# Altium footprint library Generic Footprint.PcbLib: 160 footprints (part 18 of 20)
Each footprint in its own frame and in the unit in brackets; x right, y up, seen from the top. Pads: shape width x height; smd on the part's side, far side on the other; paste and mask are expansions set on the pad; w line width, h text height; cw(c..) or ccw(c..) is an arc to the next point about the centre after c.
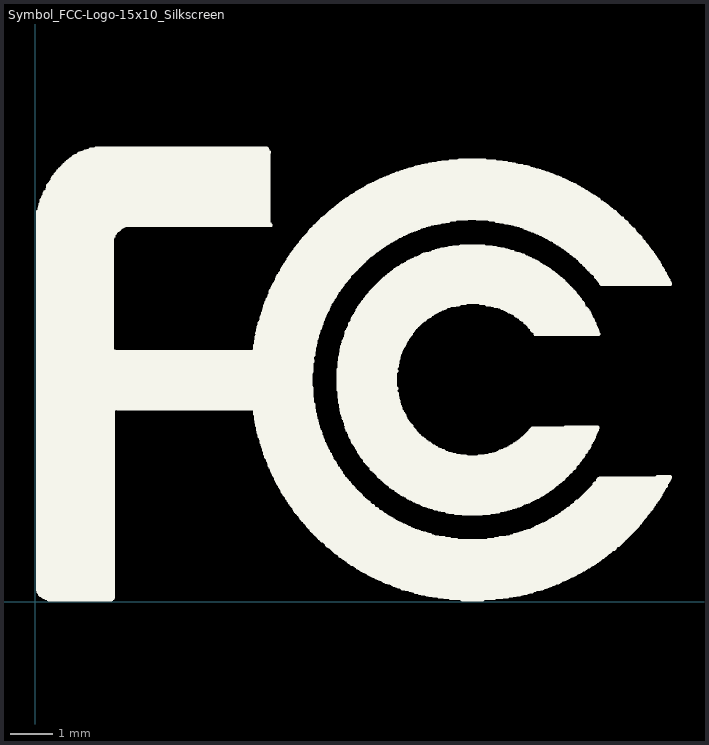
[diagram p17: the footprint, top view; thin cyan lines are the x and y axes]

## Symbol_FCC-Logo-15x10_Silkscreen [mil]
pads (8620):
  round 3.94 on Top Overlay: 1(2.65,11) 1(2.65,11.67) 1(2.65,12.34) 1(2.65,13.01) 1(2.65,13.68) 1(2.65,14.35) 1(2.65,15.02) 1(2.65,15.68) 1(2.65,16.35) 1(2.65,17.02) 1(2.65,17.69) 1(2.65,18.36) 1(2.65,19.03) 1(2.65,19.7) 1(2.65,20.37) 1(2.65,21.04) 1(2.65,21.71) 1(2.65,22.38) 1(2.65,23.05) 1(2.65,23.72) 1(2.65,24.39) 1(2.65,25.05) 1(2.65,25.72) 1(2.65,26.39) 1(2.65,27.06) 1(2.65,27.73) 1(2.65,28.4) 1(2.65,29.07) 1(2.65,29.74) 1(2.65,30.41) 1(2.65,31.08) 1(2.65,31.75) 1(2.65,32.42) 1(2.65,33.09) 1(2.65,33.76) 1(2.65,34.42) 1(2.65,35.09) 1(2.65,35.76) 1(2.65,36.43) 1(2.65,37.1) 1(2.65,37.77) 1(2.65,38.44) 1(2.65,39.11) 1(2.65,39.78) 1(2.65,40.45) 1(2.65,41.12) 1(2.65,41.79) 1(2.65,42.46) 1(2.65,43.13) 1(2.65,43.79) 1(2.65,44.46) 1(2.65,45.13) 1(2.65,45.8) 1(2.65,46.47) 1(2.65,47.14) 1(2.65,47.81) 1(2.65,48.48) 1(2.65,49.15) 1(2.65,49.82) 1(2.65,50.49) 1(2.65,51.16) 1(2.65,51.83) 1(2.65,52.5) 1(2.65,53.16) 1(2.65,53.83) 1(2.65,54.5) 1(2.65,55.17) 1(2.65,55.84) 1(2.65,56.51) 1(2.65,57.18) 1(2.65,57.85) 1(2.65,58.52) 1(2.65,59.19) 1(2.65,59.86) 1(2.65,60.53) 1(2.65,61.2) 1(2.65,61.87) 1(2.65,62.54) 1(2.65,63.2) 1(2.65,63.87) 1(2.65,64.54) 1(2.65,65.21) 1(2.65,65.88) 1(2.65,66.55) 1(2.65,67.22) 1(2.65,67.89) 1(2.65,68.56) 1(2.65,69.23) 1(2.65,69.9) 1(2.65,70.57) 1(2.65,71.24) 1(2.65,71.91) 1(2.65,72.57) 1(2.65,73.24) 1(2.65,73.91) 1(2.65,74.58) 1(2.65,75.25) 1(2.65,75.92) 1(2.65,76.59) 1(2.65,77.26) 1(2.65,77.93) 1(2.65,78.6) 1(2.65,79.27) 1(2.65,79.94) 1(2.65,80.61) 1(2.65,81.28) 1(2.65,81.94) 1(2.65,82.61) 1(2.65,83.28) 1(2.65,83.95) 1(2.65,84.62) 1(2.65,85.29) 1(2.65,85.96) 1(2.65,86.63) 1(2.65,87.3) 1(2.65,87.97) 1(2.65,88.64) 1(2.65,89.31) 1(2.65,89.98) 1(2.65,90.65) 1(2.65,91.31) 1(2.65,91.98) 1(2.65,92.65) 1(2.65,93.32) 1(2.65,93.99) 1(2.65,94.66) 1(2.65,95.33) 1(2.65,96) 1(2.65,96.67) 1(2.65,97.34) 1(2.65,98.01) 1(2.65,98.68) 1(2.65,99.35) 1(2.65,100.02) 1(2.65,100.68) 1(2.65,101.35) 1(2.65,102.02) 1(2.65,102.69) 1(2.65,103.36) 1(2.65,104.03) 1(2.65,104.7) 1(2.65,105.37) 1(2.65,106.04) 1(2.65,106.71) 1(2.65,107.38) 1(2.65,108.05) 1(2.65,108.72) 1(2.65,109.39) 1(2.65,110.05) 1(2.65,110.72) 1(2.65,111.39) 1(2.65,112.06) 1(2.65,112.73) 1(2.65,113.4) 1(2.65,114.07) 1(2.65,114.74) 1(2.65,115.41) 1(2.65,116.08) 1(2.65,116.75) 1(2.65,117.42) 1(2.65,118.09) 1(2.65,118.76) 1(2.65,119.42) 1(2.65,120.09) 1(2.65,120.76) 1(2.65,121.43) 1(2.65,122.1) 1(2.65,122.77) 1(2.65,123.44) 1(2.65,124.11) 1(2.65,124.78) 1(2.65,125.45) 1(2.65,126.12) 1(2.65,126.79) 1(2.65,127.46) 1(2.65,128.13) 1(2.65,128.79) 1(2.65,129.46) 1(2.65,130.13) 1(2.65,130.8) 1(2.65,131.47) 1(2.65,132.14) 1(2.65,132.81) 1(2.65,133.48) 1(2.65,134.15) 1(2.65,134.82) 1(2.65,135.49) 1(2.65,136.16) 1(2.65,136.83) 1(2.65,137.5) 1(2.65,138.17) 1(2.65,138.83) 1(2.65,139.5) 1(2.65,140.17) 1(2.65,140.84) 1(2.65,141.51) 1(2.65,142.18) 1(2.65,142.85) 1(2.65,143.52) 1(2.65,144.19) 1(2.65,144.86) 1(2.65,145.53) 1(2.65,146.2) 1(2.65,146.87) 1(2.65,147.54) 1(2.65,148.2) 1(2.65,148.87) 1(2.65,149.54) 1(2.65,150.21) 1(2.65,150.88) 1(2.65,151.55) 1(2.65,152.22) 1(2.65,152.89) 1(2.65,153.56) 1(2.65,154.23) 1(2.65,154.9) 1(2.65,155.57) 1(2.65,156.24) 1(2.65,156.91) 1(2.65,157.57) 1(2.65,158.24) 1(2.65,158.91) 1(2.65,159.58) 1(2.65,160.25) 1(2.65,160.92) 1(2.65,161.59) 1(2.65,162.26) 1(2.65,162.93) 1(2.65,163.6) 1(2.65,164.27) 1(2.65,164.94) 1(2.65,165.61) 1(2.65,166.28) 1(2.65,166.94) 1(2.65,167.61) 1(2.65,168.28) 1(2.65,168.95) 1(2.65,169.62) 1(2.65,170.29) 1(2.65,170.96) 1(2.65,171.63) 1(2.65,172.3) 1(2.65,172.97) 1(2.65,173.64) 1(2.65,174.31) 1(2.65,174.98) 1(2.65,175.65) 1(2.65,176.31) 1(2.65,176.98) 1(2.65,177.65) 1(2.65,178.32) 1(2.65,178.99) 1(2.65,179.66) 1(2.65,180.33) 1(2.65,181) 1(2.65,181.67) 1(2.65,182.34) 1(2.65,183.01) 1(2.65,183.68) 1(2.65,184.35) 1(2.65,185.02) 1(2.65,185.68) 1(2.65,186.35) 1(2.65,187.02) 1(2.65,187.69) 1(2.65,188.36) 1(2.65,189.03) 1(2.65,189.7) 1(2.65,190.37) 1(2.65,191.04) 1(2.65,191.71) 1(2.65,192.38) 1(2.65,193.05) 1(2.65,193.72) 1(2.65,194.39) 1(2.65,195.05) 1(2.65,195.72) 1(2.65,196.39) 1(2.65,197.06) 1(2.65,197.73) 1(2.65,198.4) 1(2.65,199.07) 1(2.65,199.74) 1(2.65,200.41) 1(2.65,201.08) 1(2.65,201.75) 1(2.65,202.42) 1(2.65,203.09) 1(2.65,203.76) 1(2.65,204.42) 1(2.65,205.09) 1(2.65,205.76) 1(2.65,206.43) 1(2.65,207.1) 1(2.65,207.77) 1(2.65,208.44) 1(2.65,209.11) 1(2.65,209.78) 1(2.65,210.45) 1(2.65,211.12) 1(2.65,211.79) 1(2.65,212.46) 1(2.65,213.13) 1(2.65,213.79) 1(2.65,214.46) 1(2.65,215.13) 1(2.65,215.8) 1(2.65,216.47) 1(2.65,217.14) 1(2.65,217.81) 1(2.65,218.48) 1(2.65,219.15) 1(2.65,219.82) 1(2.65,220.49) 1(2.65,221.16) 1(2.65,221.83) 1(2.65,222.5) 1(2.65,223.17) 1(2.65,223.83) 1(2.65,224.5) 1(2.65,225.17) 1(2.65,225.84) 1(2.65,226.51) 1(2.65,227.18) 1(2.65,227.85) 1(2.65,228.52) 1(2.65,229.19) 1(2.65,229.86) 1(2.65,230.53) 1(2.65,231.2) 1(2.65,231.87) 1(2.65,232.54) 1(2.65,233.2) 1(2.65,233.87) 1(2.65,234.54) 1(2.65,235.21) 1(2.65,235.88) 1(2.65,236.55) 1(2.65,237.22) 1(2.65,237.89) 1(2.65,238.56) 1(2.65,239.23) 1(2.65,239.9) 1(2.65,240.57) 1(2.65,241.24) 1(2.65,241.91) 1(2.65,242.57) 1(2.65,243.24) 1(2.65,243.91) 1(2.65,244.58) 1(2.65,245.25) 1(2.65,245.92) 1(2.65,246.59) 1(2.65,247.26) 1(2.65,247.93) 1(2.65,248.6) 1(2.65,249.27) 1(2.65,249.94) 1(2.65,250.61) 1(2.65,251.28) 1(2.65,251.94) 1(2.65,252.61) 1(2.65,253.28) 1(2.65,253.95) 1(2.65,254.62) 1(2.65,255.29) 1(2.65,255.96) 1(2.65,256.63) 1(2.65,257.3) 1(2.65,257.97) 1(2.65,258.64) 1(2.65,259.31) 1(2.65,259.98) 1(2.65,260.65) 1(2.65,261.31) 1(2.65,261.98) 1(2.65,262.65) 1(2.65,263.32) 1(2.65,263.99) 1(2.65,264.66) 1(2.65,265.33) 1(2.65,266) 1(2.65,266.67) 1(2.65,267.34) 1(2.65,268.01) 1(2.65,268.68) 1(2.65,269.35) 1(2.65,270.02) 1(2.65,270.68) 1(2.65,271.35) 1(2.65,272.02) 1(2.65,272.69) 1(2.65,273.36) 1(2.65,274.03) 1(2.65,274.7) 1(2.65,275.37) 1(2.65,276.04) 1(2.65,276.71) 1(2.65,277.38) 1(2.65,278.05) 1(2.65,278.72) 1(2.65,279.39) 1(2.65,280.05) 1(2.65,280.72) 1(2.65,281.39) 1(2.65,282.06) 1(2.65,282.73) 1(2.65,283.4) 1(2.65,284.07) 1(2.65,284.74) 1(2.65,285.41) 1(2.65,286.08) 1(2.65,286.75) 1(2.65,287.42) 1(2.65,288.09) 1(2.65,288.76) 1(2.65,289.42) 1(2.65,290.09) 1(2.65,290.76) 1(2.65,291.43) 1(2.65,292.1) 1(2.65,292.77) 1(2.65,293.44) 1(2.65,294.11) 1(2.65,294.78) 1(2.65,295.45) 1(2.65,296.12) 1(2.65,296.79) 1(2.65,297.46) 1(2.65,298.13) 1(2.65,298.8) 1(2.65,299.46) 1(2.65,300.13) 1(2.65,300.8) 1(2.65,301.47) 1(2.65,302.14) 1(2.65,302.81) 1(2.65,303.48) 1(2.65,304.15) 1(2.65,304.82) 1(2.65,305.49) 1(2.65,306.16) 1(2.65,306.83) 1(2.65,307.5) 1(2.65,308.17) 1(2.65,308.83) 1(2.65,309.5) 1(2.65,310.17) 1(2.65,310.84) 1(2.65,311.51) 1(2.65,312.18) 1(2.65,312.85) 1(2.65,313.52) 1(2.65,314.19) 1(2.65,314.86) 1(2.65,315.53) 1(2.65,316.2) 1(2.65,316.87) 1(2.65,317.54) 1(2.65,318.2) 1(2.65,318.87) 1(2.65,319.54) 1(2.65,320.21) 1(2.65,320.88) 1(2.65,321.55) 1(2.65,322.22) 1(2.65,322.89) 1(2.65,323.56) 1(2.65,324.23) 1(2.65,324.9) 1(2.65,325.57) 1(2.65,326.24) 1(2.65,326.91) 1(2.65,327.57) 1(2.65,328.24) 1(2.65,328.91) 1(2.65,329.58) 1(2.65,330.25) 1(2.65,330.92) 1(2.65,331.59) 1(2.65,332.26) 1(2.65,332.93) 1(2.65,333.6) 1(2.65,334.27) 1(2.65,334.94) 1(2.65,335.61) 1(2.65,336.28) 1(2.65,336.94) 1(2.65,337.61) 1(2.65,338.28) 1(2.65,338.95) 1(2.65,339.62) 1(2.65,340.29) 1(2.65,340.96) 1(2.65,341.63) 1(2.65,342.3) 1(2.65,342.97) 1(2.65,343.64) 1(2.65,344.31) 1(2.65,344.98) 1(2.65,345.65) 1(2.65,346.31) 1(2.65,346.98) 1(2.65,347.65) 1(2.65,348.32) 1(2.65,348.99) 1(2.65,349.66) 1(2.65,350.33) 1(2.65,351) 1(2.65,351.67) 1(2.65,352.34) 1(2.65,353.01) 1(2.65,353.68) 1(2.65,354.35) 1(2.65,355.02) 1(2.65,355.68) 1(2.65,356.35) 1(2.65,357.02) 1(2.65,357.69) 1(2.65,358.36) 1(2.65,359.03) 1(3.32,8.99) 1(3.99,9.66) 1(3.99,12.34) 1(3.99,13.01) 1(3.99,13.68) 1(3.99,14.35) 1(3.99,15.02) 1(3.99,15.68) 1(3.99,16.35) 1(3.99,17.02) 1(3.99,17.69) 1(3.99,18.36) 1(3.99,19.03) 1(3.99,19.7) 1(3.99,20.37) 1(3.99,21.04) 1(3.99,21.71) 1(3.99,22.38) 1(3.99,23.05) 1(3.99,23.72) 1(3.99,24.39) 1(3.99,25.05) 1(3.99,25.72) 1(3.99,26.39) 1(3.99,27.06) 1(3.99,27.73) 1(3.99,28.4) 1(3.99,29.07) 1(3.99,29.74) 1(3.99,30.41) 1(3.99,31.08) 1(3.99,31.75) 1(3.99,32.42) 1(3.99,33.09) 1(3.99,33.76) 1(3.99,34.42) 1(3.99,35.09) 1(3.99,35.76) 1(3.99,36.43) 1(3.99,37.1) 1(3.99,37.77) 1(3.99,38.44) 1(3.99,39.11) 1(3.99,39.78) 1(3.99,40.45) 1(3.99,41.12) 1(3.99,41.79) 1(3.99,42.46) 1(3.99,43.13) 1(3.99,43.79) 1(3.99,44.46) 1(3.99,45.13) 1(3.99,45.8) 1(3.99,46.47) 1(3.99,47.14) 1(3.99,47.81) 1(3.99,48.48) 1(3.99,49.15) 1(3.99,49.82) 1(3.99,50.49) 1(3.99,51.16) 1(3.99,51.83) 1(3.99,52.5) 1(3.99,53.16) 1(3.99,53.83) 1(3.99,54.5) 1(3.99,55.17) 1(3.99,55.84) 1(3.99,56.51) 1(3.99,57.18) 1(3.99,57.85) 1(3.99,58.52) 1(3.99,59.19) 1(3.99,59.86) 1(3.99,60.53) 1(3.99,61.2) 1(3.99,61.87) 1(3.99,62.54) 1(3.99,63.2) 1(3.99,63.87) 1(3.99,64.54) 1(3.99,65.21) 1(3.99,65.88) 1(3.99,66.55) 1(3.99,67.22) 1(3.99,67.89) 1(3.99,68.56) 1(3.99,69.23) 1(3.99,69.9) 1(3.99,70.57) 1(3.99,71.24) 1(3.99,71.91) 1(3.99,72.57) 1(3.99,73.24) 1(3.99,73.91) 1(3.99,74.58) 1(3.99,75.25) 1(3.99,75.92) 1(3.99,76.59) 1(3.99,77.26) 1(3.99,77.93) 1(3.99,78.6) 1(3.99,79.27) 1(3.99,79.94) 1(3.99,80.61) 1(3.99,81.28) 1(3.99,81.94) 1(3.99,82.61) 1(3.99,83.28) 1(3.99,83.95) 1(3.99,84.62) 1(3.99,85.29) 1(3.99,85.96) 1(3.99,86.63) 1(3.99,87.3) 1(3.99,87.97) 1(3.99,88.64) 1(3.99,89.31) 1(3.99,89.98) 1(3.99,90.65) 1(3.99,91.31) 1(3.99,91.98) 1(3.99,92.65) 1(3.99,93.32) 1(3.99,93.99) 1(3.99,94.66) 1(3.99,95.33) 1(3.99,96) 1(3.99,96.67) 1(3.99,97.34) 1(3.99,98.01) 1(3.99,98.68) 1(3.99,99.35) 1(3.99,100.02) 1(3.99,100.68) 1(3.99,101.35) 1(3.99,102.02) 1(3.99,102.69) 1(3.99,103.36) 1(3.99,104.03) 1(3.99,104.7) 1(3.99,105.37) 1(3.99,106.04) 1(3.99,106.71) 1(3.99,107.38) 1(3.99,108.05) 1(3.99,108.72) 1(3.99,109.39) 1(3.99,110.05) 1(3.99,110.72) 1(3.99,111.39) 1(3.99,112.06) 1(3.99,112.73) 1(3.99,113.4) 1(3.99,114.07) 1(3.99,114.74) 1(3.99,115.41) 1(3.99,116.08) 1(3.99,116.75) 1(3.99,117.42) 1(3.99,118.09) 1(3.99,118.76) 1(3.99,119.42) 1(3.99,120.09) 1(3.99,120.76) 1(3.99,121.43) 1(3.99,122.1) 1(3.99,122.77) 1(3.99,123.44) 1(3.99,124.11) 1(3.99,124.78) 1(3.99,125.45) 1(3.99,126.12) 1(3.99,126.79) 1(3.99,127.46) 1(3.99,128.13) 1(3.99,128.79) 1(3.99,129.46) 1(3.99,130.13) 1(3.99,130.8) 1(3.99,131.47) 1(3.99,132.14) 1(3.99,132.81) 1(3.99,133.48) 1(3.99,134.15) 1(3.99,134.82) 1(3.99,135.49) 1(3.99,136.16) 1(3.99,136.83) 1(3.99,137.5) 1(3.99,138.17) 1(3.99,138.83) 1(3.99,139.5) 1(3.99,140.17) 1(3.99,140.84) 1(3.99,141.51) 1(3.99,142.18) 1(3.99,142.85) 1(3.99,143.52) 1(3.99,144.19) 1(3.99,144.86) 1(3.99,145.53) 1(3.99,146.2) 1(3.99,146.87) 1(3.99,147.54) 1(3.99,148.2) 1(3.99,148.87) 1(3.99,149.54) 1(3.99,150.21) 1(3.99,150.88) 1(3.99,151.55) 1(3.99,152.22) 1(3.99,152.89) 1(3.99,153.56) 1(3.99,154.23) 1(3.99,154.9) 1(3.99,155.57) 1(3.99,156.24) 1(3.99,156.91) 1(3.99,157.57) 1(3.99,158.24) 1(3.99,158.91) 1(3.99,159.58) 1(3.99,160.25) 1(3.99,160.92) 1(3.99,161.59) 1(3.99,162.26) 1(3.99,162.93) 1(3.99,163.6) 1(3.99,164.27) 1(3.99,164.94) 1(3.99,165.61) 1(3.99,166.28) 1(3.99,166.94) 1(3.99,167.61) 1(3.99,168.28) 1(3.99,168.95) 1(3.99,169.62) 1(3.99,170.29) 1(3.99,170.96) 1(3.99,171.63) 1(3.99,172.3) 1(3.99,172.97) 1(3.99,173.64) 1(3.99,174.31) 1(3.99,174.98) 1(3.99,175.65) 1(3.99,176.31) 1(3.99,176.98) 1(3.99,177.65) 1(3.99,178.32) 1(3.99,178.99) 1(3.99,179.66) 1(3.99,180.33) 1(3.99,181) 1(3.99,181.67) 1(3.99,182.34) 1(3.99,183.01) 1(3.99,183.68) 1(3.99,184.35) 1(3.99,185.02) 1(3.99,185.68) 1(3.99,186.35) 1(3.99,187.02) 1(3.99,187.69) 1(3.99,188.36) 1(3.99,189.03) 1(3.99,189.7) 1(3.99,190.37) 1(3.99,191.04) 1(3.99,191.71) 1(3.99,192.38) 1(3.99,193.05) 1(3.99,193.72) 1(3.99,194.39) 1(3.99,195.05) 1(3.99,195.72) 1(3.99,196.39) 1(3.99,197.06) 1(3.99,197.73) 1(3.99,198.4) 1(3.99,199.07) 1(3.99,199.74) 1(3.99,200.41) 1(3.99,201.08) 1(3.99,201.75) 1(3.99,202.42) 1(3.99,203.09) 1(3.99,203.76) 1(3.99,204.42) 1(3.99,205.09) 1(3.99,205.76) 1(3.99,206.43) 1(3.99,207.1) 1(3.99,207.77) 1(3.99,208.44) 1(3.99,209.11) 1(3.99,209.78) 1(3.99,210.45) 1(3.99,211.12) 1(3.99,211.79) 1(3.99,212.46) 1(3.99,213.13) 1(3.99,213.79) 1(3.99,214.46) 1(3.99,215.13) 1(3.99,215.8) 1(3.99,216.47) 1(3.99,217.14) 1(3.99,217.81) 1(3.99,218.48) 1(3.99,219.15) 1(3.99,219.82) 1(3.99,220.49) 1(3.99,221.16) 1(3.99,221.83) 1(3.99,222.5) 1(3.99,223.17) 1(3.99,223.83) 1(3.99,224.5) 1(3.99,225.17) 1(3.99,225.84) 1(3.99,226.51) 1(3.99,227.18) 1(3.99,227.85) 1(3.99,228.52) 1(3.99,229.19) 1(3.99,229.86) 1(3.99,230.53) 1(3.99,231.2) 1(3.99,231.87) 1(3.99,232.54) 1(3.99,233.2) 1(3.99,233.87) 1(3.99,234.54) 1(3.99,235.21) 1(3.99,235.88) 1(3.99,236.55) 1(3.99,237.22) 1(3.99,237.89) 1(3.99,238.56) 1(3.99,239.23) 1(3.99,239.9) 1(3.99,240.57) 1(3.99,241.24) 1(3.99,241.91) 1(3.99,242.57) 1(3.99,243.24) 1(3.99,243.91) 1(3.99,244.58) 1(3.99,245.25) 1(3.99,245.92) 1(3.99,246.59) 1(3.99,247.26) 1(3.99,247.93) 1(3.99,248.6) 1(3.99,249.27) 1(3.99,249.94) 1(3.99,250.61) 1(3.99,251.28) 1(3.99,251.94) 1(3.99,252.61) 1(3.99,253.28) 1(3.99,253.95) 1(3.99,254.62) 1(3.99,255.29) 1(3.99,255.96) 1(3.99,256.63) 1(3.99,257.3) 1(3.99,257.97) 1(3.99,258.64) 1(3.99,259.31) 1(3.99,259.98) 1(3.99,260.65) 1(3.99,261.31) 1(3.99,261.98) 1(3.99,262.65) 1(3.99,263.32) 1(3.99,263.99) 1(3.99,264.66) 1(3.99,265.33) 1(3.99,266) 1(3.99,266.67) 1(3.99,267.34) 1(3.99,268.01) 1(3.99,268.68) 1(3.99,269.35) 1(3.99,270.02) 1(3.99,270.68) 1(3.99,271.35) 1(3.99,272.02) 1(3.99,272.69) 1(3.99,273.36) 1(3.99,274.03) 1(3.99,274.7) 1(3.99,275.37) 1(3.99,276.04) 1(3.99,276.71) 1(3.99,277.38) 1(3.99,278.05) 1(3.99,278.72) 1(3.99,279.39) 1(3.99,280.05) 1(3.99,280.72) 1(3.99,281.39) 1(3.99,282.06) 1(3.99,282.73) 1(3.99,283.4) 1(3.99,284.07) 1(3.99,284.74) 1(3.99,285.41) 1(3.99,286.08) 1(3.99,286.75) 1(3.99,287.42) 1(3.99,288.09) 1(3.99,288.76) 1(3.99,289.42) 1(3.99,290.09) 1(3.99,290.76) 1(3.99,291.43) 1(3.99,292.1) 1(3.99,292.77) 1(3.99,293.44) 1(3.99,294.11) 1(3.99,294.78) 1(3.99,295.45) 1(3.99,296.12) 1(3.99,296.79) 1(3.99,297.46) 1(3.99,298.13) 1(3.99,298.8) 1(3.99,299.46) 1(3.99,300.13) 1(3.99,300.8) 1(3.99,301.47) 1(3.99,302.14) 1(3.99,302.81) 1(3.99,303.48) 1(3.99,304.15) 1(3.99,304.82) 1(3.99,305.49) 1(3.99,306.16) 1(3.99,306.83) 1(3.99,307.5) 1(3.99,308.17) 1(3.99,308.83) 1(3.99,309.5) 1(3.99,310.17) 1(3.99,310.84) 1(3.99,311.51) 1(3.99,312.18) 1(3.99,312.85) 1(3.99,313.52) 1(3.99,314.19) 1(3.99,314.86) 1(3.99,315.53) 1(3.99,316.2) 1(3.99,316.87) 1(3.99,317.54) 1(3.99,318.2) 1(3.99,318.87) 1(3.99,319.54) 1(3.99,320.21) 1(3.99,320.88) 1(3.99,321.55) 1(3.99,322.22) 1(3.99,322.89) 1(3.99,323.56) 1(3.99,324.23) 1(3.99,324.9) 1(3.99,325.57) 1(3.99,326.24) 1(3.99,326.91) 1(3.99,327.57) 1(3.99,328.24) 1(3.99,328.91) 1(3.99,329.58) 1(3.99,330.25) 1(3.99,330.92) 1(3.99,331.59) 1(3.99,332.26) 1(3.99,332.93) 1(3.99,333.6) 1(3.99,334.27) 1(3.99,334.94) 1(3.99,335.61) 1(3.99,336.28) 1(3.99,336.94) 1(3.99,337.61) 1(3.99,338.28) 1(3.99,338.95) 1(3.99,339.62) 1(3.99,340.29) 1(3.99,340.96) 1(3.99,341.63) 1(3.99,342.3) 1(3.99,342.97) 1(3.99,343.64) 1(3.99,344.31) 1(3.99,344.98) 1(3.99,345.65) 1(3.99,346.31) 1(3.99,346.98) 1(3.99,347.65) 1(3.99,348.32) 1(3.99,348.99) 1(3.99,349.66) 1(3.99,350.33) 1(3.99,351) 1(3.99,351.67) 1(3.99,352.34) 1(3.99,353.01) 1(3.99,353.68) 1(3.99,354.35) 1(3.99,355.02) 1(3.99,355.68) 1(3.99,356.35) 1(3.99,357.02) 1(3.99,357.69) 1(3.99,359.03) 1(3.99,359.7) 1(3.99,360.37) 1(3.99,361.04) 1(3.99,361.71) 1(4.66,6.98) 1(4.66,7.65) 1(4.66,8.99) 1(4.66,10.33) 1(4.66,12.34) 1(4.66,13.01) 1(4.66,13.68) 1(4.66,14.35) 1(4.66,15.02) 1(4.66,15.68) 1(4.66,16.35) 1(4.66,17.02) 1(4.66,17.69) 1(4.66,18.36) 1(4.66,19.03) 1(4.66,19.7) 1(4.66,20.37) 1(4.66,21.04) 1(4.66,21.71) 1(4.66,22.38) 1(4.66,23.05) 1(4.66,23.72) 1(4.66,24.39) 1(4.66,25.05) 1(4.66,25.72) 1(4.66,26.39) 1(4.66,27.06) 1(4.66,27.73) 1(4.66,28.4) 1(4.66,29.07) 1(4.66,29.74) 1(4.66,30.41) 1(4.66,31.08) 1(4.66,31.75) 1(4.66,32.42) 1(4.66,33.09) 1(4.66,33.76) 1(4.66,34.42) 1(4.66,35.09) 1(4.66,35.76) 1(4.66,36.43) 1(4.66,37.1) 1(4.66,37.77) 1(4.66,38.44) 1(4.66,39.11) 1(4.66,39.78) 1(4.66,40.45) 1(4.66,41.12) 1(4.66,41.79) 1(4.66,42.46) 1(4.66,43.13) 1(4.66,43.79) 1(4.66,44.46) 1(4.66,45.13) 1(4.66,45.8) 1(4.66,46.47) 1(4.66,47.14) 1(4.66,47.81) 1(4.66,48.48) 1(4.66,49.15) 1(4.66,49.82) 1(4.66,50.49) 1(4.66,51.16) 1(4.66,51.83) 1(4.66,52.5) 1(4.66,53.16) 1(4.66,53.83) 1(4.66,54.5) 1(4.66,55.17) 1(4.66,55.84) 1(4.66,56.51) 1(4.66,57.18) 1(4.66,57.85) 1(4.66,58.52) 1(4.66,59.19) 1(4.66,59.86) 1(4.66,60.53) 1(4.66,61.2) 1(4.66,61.87) 1(4.66,62.54) 1(4.66,63.2) 1(4.66,63.87) 1(4.66,64.54) 1(4.66,65.21) 1(4.66,65.88) 1(4.66,66.55) 1(4.66,67.22) 1(4.66,67.89) 1(4.66,68.56) 1(4.66,69.23) 1(4.66,69.9) 1(4.66,70.57) 1(4.66,71.24) 1(4.66,71.91) 1(4.66,72.57) 1(4.66,73.24) 1(4.66,73.91) 1(4.66,74.58) 1(4.66,75.25) 1(4.66,75.92) 1(4.66,76.59) 1(4.66,77.26) 1(4.66,77.93) 1(4.66,78.6) 1(4.66,79.27) 1(4.66,79.94) 1(4.66,80.61) 1(4.66,81.28) 1(4.66,81.94) 1(4.66,82.61) 1(4.66,83.28) 1(4.66,83.95) 1(4.66,84.62) 1(4.66,85.29) 1(4.66,85.96) 1(4.66,86.63) 1(4.66,87.3) 1(4.66,87.97) 1(4.66,88.64) 1(4.66,89.31) 1(4.66,89.98) 1(4.66,90.65) 1(4.66,91.31) 1(4.66,91.98) 1(4.66,92.65) 1(4.66,93.32) 1(4.66,93.99) 1(4.66,94.66) 1(4.66,95.33) 1(4.66,96) 1(4.66,96.67) 1(4.66,97.34) 1(4.66,98.01) 1(4.66,98.68) 1(4.66,99.35) 1(4.66,100.02) 1(4.66,100.68) 1(4.66,101.35) 1(4.66,102.02) 1(4.66,102.69) 1(4.66,103.36) 1(4.66,104.03) 1(4.66,104.7) 1(4.66,105.37) 1(4.66,106.04) 1(4.66,106.71) 1(4.66,107.38) 1(4.66,108.05) 1(4.66,108.72) 1(4.66,109.39) 1(4.66,110.05) 1(4.66,110.72) 1(4.66,111.39) 1(4.66,112.06) 1(4.66,112.73) 1(4.66,113.4) 1(4.66,114.07) 1(4.66,114.74) 1(4.66,115.41) 1(4.66,116.08) 1(4.66,116.75) 1(4.66,117.42) 1(4.66,118.09) 1(4.66,118.76) 1(4.66,119.42) 1(4.66,120.09) 1(4.66,120.76) 1(4.66,121.43) 1(4.66,122.1) 1(4.66,122.77) 1(4.66,123.44) 1(4.66,124.11) 1(4.66,124.78) 1(4.66,125.45) 1(4.66,126.12) 1(4.66,126.79) 1(4.66,127.46) 1(4.66,128.13) 1(4.66,128.79) 1(4.66,129.46) 1(4.66,130.13) 1(4.66,130.8) 1(4.66,131.47) 1(4.66,132.14) 1(4.66,132.81) 1(4.66,133.48) 1(4.66,134.15) 1(4.66,134.82) 1(4.66,135.49) 1(4.66,136.16) 1(4.66,136.83) 1(4.66,137.5) 1(4.66,138.17) 1(4.66,138.83) 1(4.66,139.5) 1(4.66,140.17) 1(4.66,140.84) 1(4.66,141.51) 1(4.66,142.18) 1(4.66,142.85) 1(4.66,143.52) 1(4.66,144.19) 1(4.66,144.86) 1(4.66,145.53) 1(4.66,146.2) 1(4.66,146.87) 1(4.66,147.54) 1(4.66,148.2) 1(4.66,148.87) 1(4.66,149.54) 1(4.66,150.21) 1(4.66,150.88) 1(4.66,151.55) 1(4.66,152.22) 1(4.66,152.89) 1(4.66,153.56) 1(4.66,154.23) 1(4.66,154.9) 1(4.66,155.57) 1(4.66,156.24) 1(4.66,156.91) 1(4.66,157.57) 1(4.66,158.24) 1(4.66,158.91) 1(4.66,159.58) 1(4.66,160.25) 1(4.66,160.92) 1(4.66,161.59) 1(4.66,162.26) 1(4.66,162.93) 1(4.66,163.6) 1(4.66,164.27) 1(4.66,164.94) 1(4.66,165.61) 1(4.66,166.28) 1(4.66,166.94) 1(4.66,167.61) 1(4.66,168.28) 1(4.66,168.95) 1(4.66,169.62) 1(4.66,170.29) 1(4.66,170.96) 1(4.66,171.63) 1(4.66,172.3) 1(4.66,172.97) 1(4.66,173.64) 1(4.66,174.31) 1(4.66,174.98) 1(4.66,175.65) 1(4.66,176.31) 1(4.66,176.98) 1(4.66,177.65) 1(4.66,178.32) 1(4.66,178.99) 1(4.66,179.66) 1(4.66,180.33) 1(4.66,181) 1(4.66,181.67) 1(4.66,182.34) 1(4.66,183.01) 1(4.66,183.68) 1(4.66,184.35) 1(4.66,185.02) 1(4.66,185.68) 1(4.66,186.35) 1(4.66,187.02) 1(4.66,187.69) 1(4.66,188.36) 1(4.66,189.03) 1(4.66,189.7) 1(4.66,190.37) 1(4.66,191.04) 1(4.66,191.71) 1(4.66,192.38) 1(4.66,193.05) 1(4.66,193.72) 1(4.66,194.39) 1(4.66,195.05) 1(4.66,195.72) 1(4.66,196.39) 1(4.66,197.06) 1(4.66,197.73) 1(4.66,198.4) 1(4.66,199.07) 1(4.66,199.74) 1(4.66,200.41) 1(4.66,201.08) 1(4.66,201.75) 1(4.66,202.42) 1(4.66,203.09) 1(4.66,203.76) 1(4.66,204.42) 1(4.66,205.09) 1(4.66,205.76) 1(4.66,206.43) 1(4.66,207.1) 1(4.66,207.77) 1(4.66,208.44) 1(4.66,209.11) 1(4.66,209.78) 1(4.66,210.45) 1(4.66,211.12) 1(4.66,211.79) 1(4.66,212.46) 1(4.66,213.13) 1(4.66,213.79) 1(4.66,214.46) 1(4.66,215.13) 1(4.66,215.8) 1(4.66,216.47) 1(4.66,217.14) 1(4.66,217.81) 1(4.66,218.48) 1(4.66,219.15) 1(4.66,219.82) 1(4.66,220.49) 1(4.66,221.16) 1(4.66,221.83) 1(4.66,222.5) 1(4.66,223.17) 1(4.66,223.83) 1(4.66,224.5) 1(4.66,225.17) 1(4.66,225.84) 1(4.66,226.51) 1(4.66,227.18) 1(4.66,227.85) 1(4.66,228.52) 1(4.66,229.19) 1(4.66,229.86) 1(4.66,230.53) 1(4.66,231.2) 1(4.66,231.87) 1(4.66,232.54) 1(4.66,233.2) 1(4.66,233.87) 1(4.66,234.54) 1(4.66,235.21) 1(4.66,235.88) 1(4.66,236.55) 1(4.66,237.22) 1(4.66,237.89) 1(4.66,238.56) 1(4.66,239.23) 1(4.66,239.9) 1(4.66,240.57) 1(4.66,241.24) 1(4.66,241.91) 1(4.66,242.57) 1(4.66,243.24) 1(4.66,243.91) 1(4.66,244.58) 1(4.66,245.25) 1(4.66,245.92) 1(4.66,246.59) 1(4.66,247.26) 1(4.66,247.93) 1(4.66,248.6) 1(4.66,249.27) 1(4.66,249.94) 1(4.66,250.61) 1(4.66,251.28) 1(4.66,251.94) 1(4.66,252.61) 1(4.66,253.28) 1(4.66,253.95) 1(4.66,254.62) 1(4.66,255.29) 1(4.66,255.96) 1(4.66,256.63) 1(4.66,257.3) 1(4.66,257.97) 1(4.66,258.64) 1(4.66,259.31) 1(4.66,259.98) 1(4.66,260.65) 1(4.66,261.31) 1(4.66,261.98) 1(4.66,262.65) 1(4.66,263.32) 1(4.66,263.99) 1(4.66,264.66) 1(4.66,265.33) 1(4.66,266) 1(4.66,266.67) 1(4.66,267.34) 1(4.66,268.01) 1(4.66,268.68) 1(4.66,269.35) 1(4.66,270.02) 1(4.66,270.68) 1(4.66,271.35) 1(4.66,272.02) 1(4.66,272.69) 1(4.66,273.36) 1(4.66,274.03) 1(4.66,274.7) 1(4.66,275.37) 1(4.66,276.04) 1(4.66,276.71) 1(4.66,277.38) 1(4.66,278.05) 1(4.66,278.72) 1(4.66,279.39) 1(4.66,280.05) 1(4.66,280.72) 1(4.66,281.39) 1(4.66,282.06) 1(4.66,282.73) 1(4.66,283.4) 1(4.66,284.07) 1(4.66,284.74) 1(4.66,285.41) 1(4.66,286.08) 1(4.66,286.75) 1(4.66,287.42) 1(4.66,288.09) 1(4.66,288.76) 1(4.66,289.42) 1(4.66,290.09) 1(4.66,290.76) 1(4.66,291.43) 1(4.66,292.1) 1(4.66,292.77) 1(4.66,293.44) 1(4.66,294.11) 1(4.66,294.78) 1(4.66,295.45) 1(4.66,296.12) 1(4.66,296.79) 1(4.66,297.46) 1(4.66,298.13) 1(4.66,298.8) 1(4.66,299.46) 1(4.66,300.13) 1(4.66,300.8) 1(4.66,301.47) 1(4.66,302.14) 1(4.66,302.81) 1(4.66,303.48) 1(4.66,304.15) 1(4.66,304.82) 1(4.66,305.49) 1(4.66,306.16) 1(4.66,306.83) 1(4.66,307.5) 1(4.66,308.17) 1(4.66,308.83) 1(4.66,309.5) 1(4.66,310.17) 1(4.66,310.84) 1(4.66,311.51) 1(4.66,312.18) 1(4.66,312.85) 1(4.66,313.52) 1(4.66,314.19) 1(4.66,314.86) 1(4.66,315.53) 1(4.66,316.2) 1(4.66,316.87) 1(4.66,317.54) 1(4.66,318.2) 1(4.66,318.87) 1(4.66,319.54) 1(4.66,320.21) 1(4.66,320.88) 1(4.66,321.55) 1(4.66,322.22) 1(4.66,322.89) 1(4.66,323.56) 1(4.66,324.23) 1(4.66,324.9) 1(4.66,325.57) 1(4.66,326.24) 1(4.66,326.91) 1(4.66,327.57) 1(4.66,328.24) 1(4.66,328.91) 1(4.66,329.58) 1(4.66,330.25) 1(4.66,330.92) 1(4.66,331.59) 1(4.66,332.26) 1(4.66,332.93) 1(4.66,333.6) 1(4.66,334.27) 1(4.66,334.94) 1(4.66,335.61) 1(4.66,336.28) 1(4.66,336.94) 1(4.66,337.61) 1(4.66,338.28) 1(4.66,338.95) 1(4.66,339.62) 1(4.66,340.29) 1(4.66,340.96) 1(4.66,341.63) 1(4.66,342.3) 1(4.66,342.97) 1(4.66,343.64) 1(4.66,344.31) 1(4.66,344.98) 1(4.66,345.65) 1(4.66,346.31) 1(4.66,346.98) 1(4.66,347.65) 1(4.66,348.32) 1(4.66,348.99) 1(4.66,349.66) 1(4.66,350.33) 1(4.66,351) 1(4.66,351.67) 1(4.66,352.34) 1(4.66,353.01) 1(4.66,353.68) 1(4.66,354.35) 1(4.66,355.02) 1(4.66,355.68) 1(4.66,356.35) 1(4.66,357.02) 1(4.66,357.69) 1(4.66,359.03) 1(4.66,359.7) 1(4.66,360.37) 1(4.66,361.04) 1(4.66,361.71) 1(4.66,362.38) 1(4.66,363.05) 1(4.66,363.72) 1(5.33,6.31) 1(5.33,6.98) 1(5.33,7.65) 1(5.33,8.99) 1(5.33,359.7) 1(5.33,360.37) 1(5.33,361.04) 1(5.33,361.71) 1(5.33,362.38) 1(5.33,363.05) 1(5.33,363.72) 1(5.33,365.05) 1(5.33,365.72) 1(5.33,366.39) 1(6,6.98) 1(6,7.65) 1(6,8.32) 1(6,362.38) 1(6,363.05) 1(6,363.72) 1(6,364.39) 1(6,365.05) 1(6,365.72) 1(6,366.39) 1(6,367.73) 1(6,369.74) 1(6.67,5.65) 1(6.67,6.31) 1(6.67,365.05) 1(6.67,365.72) 1(6.67,366.39) 1(6.67,367.06) 1(6.67,367.73) 1(6.67,369.07) 1(7.34,4.98) 1(7.34,5.65) 1(7.34,6.31) 1(7.34,369.74) 1(7.34,371.08) 1(7.34,371.75) 1(7.34,372.42) 1(8.01,367.73) 1(8.01,368.4) 1(8.01,373.09) 1(8.68,4.31) 1(8.68,369.74) 1(8.68,370.41) 1(8.68,373.76) 1(8.68,374.42) 1(8.68,375.09) 1(8.68,375.76) 1(9.34,4.98) 1(9.34,5.65) 1(9.34,374.42) 1(9.34,375.09) 1(9.34,375.76) 1(9.34,377.1) 1(10.01,3.64) 1(10.01,374.42) 1(10.01,375.09) 1(10.01,375.76) 1(10.01,377.1) 1(10.68,4.31) 1(10.68,4.98) 1(11.35,376.43) 1(11.35,377.1) 1(11.35,379.78) 1(12.02,2.97) 1(12.02,377.77) 1(12.02,378.44) 1(12.02,379.11) 1(12.02,379.78) 1(12.02,381.12) 1(12.02,381.79) 1(12.02,382.46) 1(12.02,383.13) 1(12.69,2.3) 1(12.69,3.64) 1(12.69,4.31) 1(12.69,379.78) 1(12.69,380.45) 1(12.69,381.12) 1(12.69,381.79) 1(12.69,383.8) 1(13.36,381.12) 1(13.36,381.79) 1(13.36,383.13) 1(13.36,383.8) 1(13.36,384.46) 1(14.03,383.13) 1(14.03,383.8) 1(14.03,385.13) 1(14.7,385.8) 1(14.7,386.47) 1(15.37,386.47) 1(15.37,387.14) 1(16.04,386.47) 1(16.04,387.14) 1(16.04,388.48) 1(16.04,389.15) 1(16.71,387.14) 1(16.71,388.48) 1(16.71,389.15) 1(16.71,390.49) 1(17.38,387.81) 1(17.38,389.82) 1(17.38,391.16) 1(18.05,388.48) 1(18.05,389.15) 1(18.05,389.82) 1(18.05,390.49) 1(18.72,389.82) 1(18.72,390.49) 1(18.72,391.83) 1(18.72,392.5) 1(18.72,393.17) 1(19.38,393.83) 1(20.05,394.5) 1(21.39,395.84) 1(21.39,396.51) 1(22.06,395.84) 1(22.06,396.51) 1(22.06,397.18) 1(22.73,395.17) 1(22.73,395.84) 1(22.73,397.18) 1(22.73,397.85) 1(23.4,396.51) 1(23.4,397.85) 1(23.4,398.52) 1(24.07,397.18) 1(24.07,397.85) 1(24.07,399.19) 1(24.74,398.52) 1(24.74,399.86) 1(25.41,398.52) 1(25.41,400.53) 1(26.08,401.2) 1(26.75,400.53) 1(26.75,401.87) 1(27.42,400.53) 1(27.42,401.2) 1(27.42,402.54) 1(28.09,401.2) 1(28.09,401.87) 1(28.09,403.2) 1(28.75,401.87) 1(28.75,402.54) 1(28.75,403.2) 1(28.75,403.87) 1(29.42,402.54) 1(29.42,403.87) 1(29.42,404.54) 1(30.09,403.2) 1(30.09,405.21) 1(30.76,403.87) 1(31.43,405.88) 1(32.1,406.55) 1(32.77,407.22) 1(33.44,406.55) 1(34.11,407.89) 1(34.78,406.55) 1(34.78,408.56) 1(35.45,409.23) 1(36.12,408.56) 1(36.12,409.23) 1(36.12,409.9) 1(37.46,408.56) 1(37.46,409.9) 1(37.46,410.57) 1(38.12,409.23) 1(39.46,409.9) 1(39.46,411.24) 1(40.13,411.91) 1(40.8,412.57) 1(42.81,411.91) 1(42.81,412.57) 1(42.81,413.24) 1(44.15,411.91) 1(44.15,412.57) 1(44.82,413.24) 1(44.82,413.91) 1(46.16,413.24) 1(46.16,413.91) 1(46.16,414.58) 1(48.83,413.91) 1(48.83,414.58) 1(48.83,415.25) 1(50.84,415.92) 1(51.51,414.58) 1(51.51,416.59) 1(52.18,415.25) 1(55.53,415.25) 1(56.2,417.26) 1(69.58,2.97) 1(69.58,5.65) 1(69.58,6.31) 1(69.58,6.98) 1(69.58,7.65) 1(69.58,8.32) 1(69.58,8.99) 1(69.58,9.66) 1(69.58,10.33) 1(69.58,11) 1(69.58,11.67) 1(69.58,12.34) 1(69.58,13.01) 1(69.58,13.68) 1(69.58,14.35) 1(69.58,15.02) 1(69.58,15.68) 1(69.58,16.35) 1(69.58,17.02) 1(69.58,17.69) 1(69.58,18.36) 1(69.58,19.03) 1(69.58,19.7) 1(69.58,20.37) 1(69.58,21.04) 1(69.58,21.71) 1(69.58,22.38) 1(69.58,23.05) 1(69.58,23.72) 1(69.58,24.39) 1(69.58,25.05) 1(69.58,25.72) 1(69.58,26.39) 1(69.58,27.06) 1(69.58,27.73) 1(69.58,28.4) 1(69.58,29.07) 1(69.58,29.74) 1(69.58,30.41) 1(69.58,31.08) 1(69.58,31.75) 1(69.58,32.42) 1(69.58,33.09) 1(69.58,33.76) 1(69.58,34.42) 1(69.58,35.09) 1(69.58,35.76) 1(69.58,36.43) 1(69.58,37.1) 1(69.58,37.77) 1(69.58,38.44) 1(69.58,39.11) 1(69.58,39.78) 1(69.58,40.45) 1(69.58,41.12) 1(69.58,41.79) 1(69.58,42.46) 1(69.58,43.13) 1(69.58,43.79) 1(69.58,44.46) 1(69.58,45.13) 1(69.58,45.8) 1(69.58,46.47) 1(69.58,47.14) 1(69.58,47.81) 1(69.58,48.48) 1(69.58,49.15) 1(69.58,49.82) 1(69.58,50.49) 1(69.58,51.16) 1(69.58,51.83) 1(69.58,52.5) 1(69.58,53.16) 1(69.58,53.83) 1(69.58,54.5) 1(69.58,55.17) 1(69.58,55.84) 1(69.58,56.51) 1(69.58,57.18) 1(69.58,57.85) 1(69.58,58.52) 1(69.58,59.19) 1(69.58,59.86) 1(69.58,60.53) 1(69.58,61.2) 1(69.58,61.87) 1(69.58,62.54) 1(69.58,63.2) 1(69.58,63.87) 1(69.58,64.54) 1(69.58,65.21) 1(69.58,65.88) 1(69.58,66.55) 1(69.58,67.22) 1(69.58,67.89) 1(69.58,68.56) 1(69.58,69.23) 1(69.58,69.9) 1(69.58,70.57) 1(69.58,71.24) 1(69.58,71.91) 1(69.58,72.57) 1(69.58,73.24) 1(69.58,73.91) 1(69.58,74.58) 1(69.58,75.25) 1(69.58,75.92) 1(69.58,76.59) 1(69.58,77.26) 1(69.58,77.93) 1(69.58,78.6) 1(69.58,79.27) 1(69.58,79.94) 1(69.58,80.61) 1(69.58,81.28) 1(69.58,81.94) 1(69.58,82.61) 1(69.58,83.28) 1(69.58,83.95) 1(69.58,84.62) 1(69.58,85.29) 1(69.58,85.96) 1(69.58,86.63) 1(69.58,87.3) 1(69.58,87.97) 1(69.58,88.64) 1(69.58,89.31) 1(69.58,89.98) 1(69.58,90.65) 1(69.58,91.31) 1(69.58,91.98) 1(69.58,92.65) 1(69.58,93.32) 1(69.58,93.99) 1(69.58,94.66) 1(69.58,95.33) 1(69.58,96) 1(69.58,96.67) 1(69.58,97.34) 1(69.58,98.01) 1(69.58,98.68) 1(69.58,99.35) 1(69.58,100.02) 1(69.58,100.68) 1(69.58,101.35) 1(69.58,102.02) 1(69.58,102.69) 1(69.58,103.36) 1(69.58,104.03) 1(69.58,104.7) 1(69.58,105.37) 1(69.58,106.04) 1(69.58,106.71) 1(69.58,107.38) 1(69.58,108.05) 1(69.58,108.72) 1(69.58,109.39) 1(69.58,110.05) 1(69.58,110.72) 1(69.58,111.39) 1(69.58,112.06) 1(69.58,112.73) 1(69.58,113.4) 1(69.58,114.07) 1(69.58,114.74) 1(69.58,115.41) 1(69.58,116.08) 1(69.58,116.75) 1(69.58,117.42) 1(69.58,118.09) 1(69.58,118.76) 1(69.58,119.42) 1(69.58,120.09) 1(69.58,120.76) 1(69.58,121.43) 1(69.58,122.1) 1(69.58,122.77) 1(69.58,123.44) 1(69.58,124.11) 1(69.58,124.78) 1(69.58,125.45) 1(69.58,126.12) 1(69.58,126.79) 1(69.58,127.46) 1(69.58,128.13) 1(69.58,128.79) 1(69.58,129.46) 1(69.58,130.13) 1(69.58,130.8) 1(69.58,131.47) 1(69.58,132.14) 1(69.58,132.81) 1(69.58,133.48) 1(69.58,134.15) 1(69.58,134.82) 1(69.58,135.49) 1(69.58,136.16) 1(69.58,136.83) 1(69.58,137.5) 1(69.58,138.17) 1(69.58,138.83) 1(69.58,139.5) 1(69.58,140.17) 1(69.58,140.84) 1(69.58,141.51) 1(69.58,142.18) 1(69.58,142.85) 1(69.58,143.52) 1(69.58,144.19) 1(69.58,144.86) 1(69.58,145.53) 1(69.58,146.2) 1(69.58,146.87) 1(69.58,147.54) 1(69.58,148.2) 1(69.58,148.87) 1(69.58,149.54) 1(69.58,150.21) 1(69.58,150.88) 1(69.58,151.55) 1(69.58,152.22) 1(69.58,152.89) 1(69.58,153.56) 1(69.58,154.23) 1(69.58,154.9) 1(69.58,155.57) 1(69.58,156.24) 1(69.58,156.91) 1(69.58,157.57) 1(69.58,158.24) 1(69.58,158.91) 1(69.58,159.58) 1(69.58,160.25) 1(69.58,160.92) 1(69.58,161.59) 1(69.58,162.26) 1(69.58,162.93) 1(69.58,163.6) 1(69.58,164.27) 1(69.58,164.94) 1(69.58,165.61) 1(69.58,166.28) 1(69.58,166.94) 1(69.58,167.61) 1(69.58,168.28) 1(69.58,168.95) 1(69.58,169.62) 1(69.58,170.29) 1(69.58,170.96) 1(69.58,171.63) 1(69.58,172.3) 1(69.58,172.97) 1(69.58,173.64) 1(69.58,174.98) 1(69.58,336.28) 1(69.58,336.94) 1(70.25,2.3) 1(70.25,5.65) 1(70.25,6.31) 1(70.25,6.98) 1(70.25,7.65) 1(70.25,8.32) 1(70.25,8.99) 1(70.25,9.66) 1(70.25,10.33) 1(70.25,11) 1(70.25,11.67) 1(70.25,12.34) 1(70.25,13.01) 1(70.25,13.68) 1(70.25,14.35) 1(70.25,15.02) 1(70.25,15.68) 1(70.25,16.35) 1(70.25,17.02) 1(70.25,17.69) 1(70.25,18.36) 1(70.25,19.03) 1(70.25,19.7) 1(70.25,20.37) 1(70.25,21.04) 1(70.25,21.71) 1(70.25,22.38) 1(70.25,23.05) 1(70.25,23.72) 1(70.25,24.39) 1(70.25,25.05) 1(70.25,25.72) 1(70.25,26.39) 1(70.25,27.06) 1(70.25,27.73) 1(70.25,28.4) 1(70.25,29.07) 1(70.25,29.74) 1(70.25,30.41) 1(70.25,31.08) 1(70.25,31.75) 1(70.25,32.42) 1(70.25,33.09) 1(70.25,33.76) 1(70.25,34.42) 1(70.25,35.09) 1(70.25,35.76) 1(70.25,36.43) 1(70.25,37.1) 1(70.25,37.77) 1(70.25,38.44) 1(70.25,39.11) 1(70.25,39.78) 1(70.25,40.45) 1(70.25,41.12) 1(70.25,41.79) 1(70.25,42.46) 1(70.25,43.13) 1(70.25,43.79) 1(70.25,44.46) 1(70.25,45.13) 1(70.25,45.8) 1(70.25,46.47) 1(70.25,47.14) 1(70.25,47.81) 1(70.25,48.48) 1(70.25,49.15) 1(70.25,49.82) 1(70.25,50.49) 1(70.25,51.16) 1(70.25,51.83) 1(70.25,52.5) 1(70.25,53.16) 1(70.25,53.83) 1(70.25,54.5) 1(70.25,55.17) 1(70.25,55.84) 1(70.25,56.51) 1(70.25,57.18) 1(70.25,57.85) 1(70.25,58.52) 1(70.25,59.19) 1(70.25,59.86) 1(70.25,60.53) 1(70.25,61.2) 1(70.25,61.87) 1(70.25,62.54) 1(70.25,63.2) 1(70.25,63.87) 1(70.25,64.54) 1(70.25,65.21) 1(70.25,65.88) 1(70.25,66.55) 1(70.25,67.22) 1(70.25,67.89) 1(70.25,68.56) 1(70.25,69.23) 1(70.25,69.9) 1(70.25,70.57) 1(70.25,71.24) 1(70.25,71.91) 1(70.25,72.57) 1(70.25,73.24) 1(70.25,73.91) 1(70.25,74.58) 1(70.25,75.25) 1(70.25,75.92) 1(70.25,76.59) 1(70.25,77.26) 1(70.25,77.93) 1(70.25,78.6) 1(70.25,79.27) 1(70.25,79.94) 1(70.25,80.61) 1(70.25,81.28) 1(70.25,81.94) 1(70.25,82.61) 1(70.25,83.28) 1(70.25,83.95) 1(70.25,84.62) 1(70.25,85.29) 1(70.25,85.96) 1(70.25,86.63) 1(70.25,87.3) 1(70.25,87.97) 1(70.25,88.64) 1(70.25,89.31) 1(70.25,89.98) 1(70.25,90.65) 1(70.25,91.31) 1(70.25,91.98) 1(70.25,92.65) 1(70.25,93.32) 1(70.25,93.99) 1(70.25,94.66) 1(70.25,95.33) 1(70.25,96) 1(70.25,96.67) 1(70.25,97.34) 1(70.25,98.01) 1(70.25,98.68) 1(70.25,99.35) 1(70.25,100.02) 1(70.25,100.68) 1(70.25,101.35) 1(70.25,102.02) 1(70.25,102.69) 1(70.25,103.36) 1(70.25,104.03) 1(70.25,104.7) 1(70.25,105.37) 1(70.25,106.04) 1(70.25,106.71) 1(70.25,107.38) 1(70.25,108.05) 1(70.25,108.72) 1(70.25,109.39) 1(70.25,110.05) 1(70.25,110.72) 1(70.25,111.39) 1(70.25,112.06) 1(70.25,112.73) 1(70.25,113.4) 1(70.25,114.07) 1(70.25,114.74) 1(70.25,115.41) 1(70.25,116.08) 1(70.25,116.75) 1(70.25,117.42) 1(70.25,118.09) 1(70.25,118.76) 1(70.25,119.42) 1(70.25,120.09) 1(70.25,120.76) 1(70.25,121.43) 1(70.25,122.1) 1(70.25,122.77) 1(70.25,123.44) 1(70.25,124.11) 1(70.25,124.78) 1(70.25,125.45) 1(70.25,126.12) 1(70.25,126.79) 1(70.25,127.46) 1(70.25,128.13) 1(70.25,128.79) 1(70.25,129.46) 1(70.25,130.13) 1(70.25,130.8) 1(70.25,131.47) 1(70.25,132.14) 1(70.25,132.81) 1(70.25,133.48) 1(70.25,134.15) 1(70.25,134.82) 1(70.25,135.49) 1(70.25,136.16) 1(70.25,136.83) 1(70.25,137.5) 1(70.25,138.17) 1(70.25,138.83) 1(70.25,139.5) 1(70.25,140.17) 1(70.25,140.84) 1(70.25,141.51) 1(70.25,142.18) 1(70.25,142.85) 1(70.25,143.52) 1(70.25,144.19) 1(70.25,144.86) 1(70.25,145.53) 1(70.25,146.2) 1(70.25,146.87) 1(70.25,147.54) 1(70.25,148.2) 1(70.25,148.87) 1(70.25,149.54) 1(70.25,150.21) 1(70.25,150.88) 1(70.25,151.55) 1(70.25,152.22) 1(70.25,152.89) 1(70.25,153.56) 1(70.25,154.23) 1(70.25,154.9) 1(70.25,155.57) 1(70.25,156.24) 1(70.25,156.91) 1(70.25,157.57) 1(70.25,158.24) 1(70.25,158.91) 1(70.25,159.58) 1(70.25,160.25) 1(70.25,160.92) 1(70.25,161.59) 1(70.25,162.26) 1(70.25,162.93) 1(70.25,163.6) 1(70.25,164.27) 1(70.25,164.94) 1(70.25,165.61) 1(70.25,166.28) 1(70.25,166.94) 1(70.25,167.61) 1(70.25,168.28) 1(70.25,168.95) 1(70.25,169.62) 1(70.25,170.29) 1(70.25,170.96) 1(70.25,171.63) 1(70.25,172.3) 1(70.25,172.97) 1(70.25,173.64) 1(70.25,174.98) 1(70.25,176.98) 1(70.25,336.28) 1(70.25,336.94) 1(70.25,337.61) 1(70.25,338.28) 1(70.92,3.64) 1(70.92,4.31) 1(70.92,176.31) 1(70.92,231.2) 1(70.92,231.87) 1(70.92,232.54) 1(70.92,233.2) 1(70.92,233.87) 1(70.92,234.54) 1(70.92,235.21) 1(70.92,235.88) 1(70.92,236.55) 1(70.92,237.22) 1(70.92,237.89) 1(70.92,238.56) 1(70.92,239.23) 1(70.92,239.9) 1(70.92,240.57) 1(70.92,241.24) 1(70.92,241.91) 1(70.92,242.57) 1(70.92,243.24) 1(70.92,243.91) 1(70.92,244.58) 1(70.92,245.25) 1(70.92,245.92) 1(70.92,246.59) 1(70.92,247.26) 1(70.92,247.93) 1(70.92,248.6) 1(70.92,249.27) 1(70.92,249.94) 1(70.92,250.61) 1(70.92,251.28) 1(70.92,251.94) 1(70.92,252.61) 1(70.92,253.28) 1(70.92,253.95) 1(70.92,254.62) 1(70.92,255.29) 1(70.92,255.96) 1(70.92,256.63) 1(70.92,257.3) 1(70.92,257.97) 1(70.92,258.64) 1(70.92,259.31) 1(70.92,259.98) 1(70.92,260.65) 1(70.92,261.31) 1(70.92,261.98) 1(70.92,262.65) 1(70.92,263.32) 1(70.92,263.99) 1(70.92,264.66) 1(70.92,265.33) 1(70.92,266) 1(70.92,266.67) 1(70.92,267.34) 1(70.92,268.01) 1(70.92,268.68) 1(70.92,269.35) 1(70.92,270.02) 1(70.92,270.68) 1(70.92,271.35) 1(70.92,272.02) 1(70.92,272.69) 1(70.92,273.36) 1(70.92,274.03) 1(70.92,274.7) 1(70.92,275.37) 1(70.92,276.04) 1(70.92,276.71) 1(70.92,277.38) 1(70.92,278.05) 1(70.92,278.72) 1(70.92,279.39) 1(70.92,280.05) 1(70.92,280.72) 1(70.92,281.39) 1(70.92,282.06) 1(70.92,282.73) 1(70.92,283.4) 1(70.92,284.07) 1(70.92,284.74) 1(70.92,285.41) 1(70.92,286.08) 1(70.92,286.75) 1(70.92,287.42) 1(70.92,288.09) 1(70.92,288.76) 1(70.92,289.42) 1(70.92,290.09) 1(70.92,290.76) 1(70.92,291.43) 1(70.92,292.1) 1(70.92,292.77) 1(70.92,293.44) 1(70.92,294.11) 1(70.92,294.78) 1(70.92,295.45) 1(70.92,296.12) 1(70.92,296.79) 1(70.92,297.46) 1(70.92,298.13) 1(70.92,298.8) 1(70.92,299.46) 1(70.92,300.13) 1(70.92,300.8) 1(70.92,301.47) 1(70.92,302.14) 1(70.92,302.81) 1(70.92,303.48) 1(70.92,304.15) 1(70.92,304.82) 1(70.92,305.49) 1(70.92,306.16) 1(70.92,306.83) 1(70.92,307.5) 1(70.92,308.17) 1(70.92,308.83) 1(70.92,309.5) 1(70.92,310.17) 1(70.92,310.84) 1(70.92,311.51) 1(70.92,312.18) 1(70.92,312.85) 1(70.92,313.52) 1(70.92,314.19) 1(70.92,314.86) 1(70.92,315.53) 1(70.92,316.2) 1(70.92,316.87) 1(70.92,317.54) 1(70.92,318.2) 1(70.92,318.87) 1(70.92,319.54) 1(70.92,320.21) 1(70.92,320.88) 1(70.92,321.55) 1(70.92,322.22) 1(70.92,322.89) 1(70.92,323.56) 1(70.92,324.23) 1(70.92,324.9) 1(70.92,325.57) 1(70.92,326.24) 1(70.92,326.91) 1(70.92,327.57) 1(70.92,328.24) 1(70.92,328.91) 1(70.92,329.58) 1(70.92,330.25) 1(70.92,330.92) 1(70.92,331.59) 1(70.92,332.26) 1(70.92,332.93) 1(70.92,333.6) 1(70.92,334.27) 1(70.92,334.94) 1(70.92,335.61) 1(70.92,336.94) 1(71.59,3.64) 1(71.59,4.98) 1(71.59,5.65) 1(71.59,6.31) 1(71.59,6.98) 1(71.59,7.65) 1(71.59,8.32) 1(71.59,8.99) 1(71.59,9.66) 1(71.59,10.33) 1(71.59,11) 1(71.59,11.67) 1(71.59,12.34) 1(71.59,13.01) 1(71.59,13.68) 1(71.59,14.35) 1(71.59,15.02) 1(71.59,15.68) 1(71.59,16.35) 1(71.59,17.02) 1(71.59,17.69) 1(71.59,18.36) 1(71.59,19.03) 1(71.59,19.7) 1(71.59,20.37) 1(71.59,21.04) 1(71.59,21.71) 1(71.59,22.38) 1(71.59,23.05) 1(71.59,23.72) 1(71.59,24.39) 1(71.59,25.05) 1(71.59,25.72) 1(71.59,26.39) 1(71.59,27.06) 1(71.59,27.73) 1(71.59,28.4) 1(71.59,29.07) 1(71.59,29.74) 1(71.59,30.41) 1(71.59,31.08) 1(71.59,31.75) 1(71.59,32.42) 1(71.59,33.09) 1(71.59,33.76) 1(71.59,34.42) 1(71.59,35.09) 1(71.59,35.76) 1(71.59,36.43) 1(71.59,37.1) 1(71.59,37.77) 1(71.59,38.44) 1(71.59,39.11) 1(71.59,39.78) 1(71.59,40.45) 1(71.59,41.12) 1(71.59,41.79) 1(71.59,42.46) 1(71.59,43.13) 1(71.59,43.79) 1(71.59,44.46) 1(71.59,45.13) 1(71.59,45.8) 1(71.59,46.47) 1(71.59,47.14) 1(71.59,47.81) 1(71.59,48.48) 1(71.59,49.15) 1(71.59,49.82) 1(71.59,50.49) 1(71.59,51.16) 1(71.59,51.83) 1(71.59,52.5) 1(71.59,53.16) 1(71.59,53.83) 1(71.59,54.5) 1(71.59,55.17) 1(71.59,55.84) 1(71.59,56.51) 1(71.59,57.18) 1(71.59,57.85) 1(71.59,58.52) 1(71.59,59.19) 1(71.59,59.86) 1(71.59,60.53) 1(71.59,61.2) 1(71.59,61.87) 1(71.59,62.54) 1(71.59,63.2) 1(71.59,63.87) 1(71.59,64.54) 1(71.59,65.21) 1(71.59,65.88) 1(71.59,66.55) 1(71.59,67.22) 1(71.59,67.89) 1(71.59,68.56) 1(71.59,69.23) 1(71.59,69.9) 1(71.59,70.57) 1(71.59,71.24) 1(71.59,71.91) 1(71.59,72.57) 1(71.59,73.24) 1(71.59,73.91) 1(71.59,74.58) 1(71.59,75.25) 1(71.59,75.92) 1(71.59,76.59) 1(71.59,77.26) 1(71.59,77.93) 1(71.59,78.6) 1(71.59,79.27) 1(71.59,79.94) 1(71.59,80.61) 1(71.59,81.28) 1(71.59,81.94) 1(71.59,82.61) 1(71.59,83.28) 1(71.59,83.95) 1(71.59,84.62) 1(71.59,85.29) 1(71.59,85.96) 1(71.59,86.63) 1(71.59,87.3) 1(71.59,87.97) 1(71.59,88.64) 1(71.59,89.31) 1(71.59,89.98) 1(71.59,90.65) 1(71.59,91.31) 1(71.59,91.98) 1(71.59,92.65) 1(71.59,93.32) 1(71.59,93.99) 1(71.59,94.66) 1(71.59,95.33) 1(71.59,96) 1(71.59,96.67) 1(71.59,97.34) 1(71.59,98.01) 1(71.59,98.68) 1(71.59,99.35) 1(71.59,100.02) 1(71.59,100.68) 1(71.59,101.35) 1(71.59,102.02) 1(71.59,102.69) 1(71.59,103.36) 1(71.59,104.03) 1(71.59,104.7) 1(71.59,105.37) 1(71.59,106.04) 1(71.59,106.71) 1(71.59,107.38) 1(71.59,108.05) 1(71.59,108.72) 1(71.59,109.39) 1(71.59,110.05) 1(71.59,110.72) 1(71.59,111.39) 1(71.59,112.06) 1(71.59,112.73) 1(71.59,113.4) 1(71.59,114.07) 1(71.59,114.74) 1(71.59,115.41) 1(71.59,116.08) 1(71.59,116.75) 1(71.59,117.42) 1(71.59,118.09) 1(71.59,118.76) 1(71.59,119.42) 1(71.59,120.09) 1(71.59,120.76) 1(71.59,121.43) 1(71.59,122.1) 1(71.59,122.77) 1(71.59,123.44) 1(71.59,124.11) 1(71.59,124.78) 1(71.59,125.45) 1(71.59,126.12) 1(71.59,126.79) 1(71.59,127.46) 1(71.59,128.13) 1(71.59,128.79) 1(71.59,129.46) 1(71.59,130.13) 1(71.59,130.8) 1(71.59,131.47) 1(71.59,132.14) 1(71.59,132.81) 1(71.59,133.48) 1(71.59,134.15) 1(71.59,134.82) 1(71.59,135.49) 1(71.59,136.16) 1(71.59,136.83) 1(71.59,137.5) 1(71.59,138.17) 1(71.59,138.83) 1(71.59,139.5) 1(71.59,140.17) 1(71.59,140.84) 1(71.59,141.51) 1(71.59,142.18) 1(71.59,142.85) 1(71.59,143.52) 1(71.59,144.19) 1(71.59,144.86) 1(71.59,145.53) 1(71.59,146.2) 1(71.59,146.87) 1(71.59,147.54) 1(71.59,148.2) 1(71.59,148.87) 1(71.59,149.54) 1(71.59,150.21) 1(71.59,150.88) 1(71.59,151.55) 1(71.59,152.22) 1(71.59,152.89) 1(71.59,153.56) 1(71.59,154.23) 1(71.59,154.9) 1(71.59,155.57) 1(71.59,156.24) 1(71.59,156.91) 1(71.59,157.57) 1(71.59,158.24) 1(71.59,158.91) 1(71.59,159.58) 1(71.59,160.25) 1(71.59,160.92) 